# Altium schematic symbol library jlcpcb_2025_04_capacitors_extended_0201.schlib: 1175 symbols (part 5 of 7) (continued)
## GRM0335C1H1R0CA01D
designator C?  Capacitance: 1pF  (hidden comment: *)
Capacitor, Ceramic (MLCC), 1pF, 50V, C0G, SMD 0201; Manufacturer: Murata Electronics; Manufacturer Part Number: GRM0335C1H1R0CA01D; Package Size: 0201; JLCPCB Basic Part: No; JLCPCB Part Number: C85894; Supplier 1: LCSC; Category: Capacitors - MLCC; Supplier Part Number 1: C85894; Voltage Rating: 50V; Temperature Coefficient: C0G; RoHS: Yes; ComponentLink1Description: Datasheet; ComponentLink1URL: https://wmsc.lcsc.com/wmsc/upload/file/pdf/v2/lcsc/2304140030_Murata-Electronics-GRM0335C1H1R0CA01D_C85894.pdf; ComponentLink2Description: JLCPCB Part URL; ComponentLink2URL: https://jlcpcb.com/partdetail/C85894; ComponentLink3Description: LCSC Part URL; ComponentLink3URL: https://lcsc.com/product-detail/Multilayer-Ceramic-Capacitors-MLCC---SMD-SMT_Murata-Electronics-Murata-Electronics-GRM0335C1H1R0CA01D_C85894.html
footprint CAP-0201 (0201 (0603M) Capacitor)
pins: 1, 2

## GRM0335C1H1R0WA01D
designator C?  Capacitance: 1pF  (hidden comment: *)
Capacitor, Ceramic (MLCC), 1pF, 50V, C0G, SMD 0201; Manufacturer: Murata Electronics; Manufacturer Part Number: GRM0335C1H1R0WA01D; Package Size: 0201; JLCPCB Basic Part: No; JLCPCB Part Number: C161411; Supplier 1: LCSC; Category: Capacitors - MLCC; Supplier Part Number 1: C161411; Voltage Rating: 50V; Temperature Coefficient: C0G; RoHS: Yes; ComponentLink1Description: Datasheet; ComponentLink1URL: https://wmsc.lcsc.com/wmsc/upload/file/pdf/v2/lcsc/1811081546_Murata-Electronics-GRM0335C1H1R0WA01D_C161411.pdf; ComponentLink2Description: JLCPCB Part URL; ComponentLink2URL: https://jlcpcb.com/partdetail/C161411; ComponentLink3Description: LCSC Part URL; ComponentLink3URL: https://lcsc.com/product-detail/Multilayer-Ceramic-Capacitors-MLCC---SMD-SMT_Murata-Electronics-Murata-Electronics-GRM0335C1H1R0WA01D_C161411.html
footprint CAP-0201 (0201 (0603M) Capacitor)
pins: 1, 2

## GRM0335C1H1R1BA01D
designator C?  Capacitance: 1.1pF  (hidden comment: *)
Capacitor, Ceramic (MLCC), 1.1pF, 50V, C0G, SMD 0201; Manufacturer: Murata Electronics; Manufacturer Part Number: GRM0335C1H1R1BA01D; Package Size: 0201; JLCPCB Basic Part: No; JLCPCB Part Number: C384969; Supplier 1: LCSC; Category: Capacitors - MLCC; Supplier Part Number 1: C384969; Voltage Rating: 50V; Temperature Coefficient: C0G; RoHS: Yes; ComponentLink1Description: Datasheet; ComponentLink1URL: https://wmsc.lcsc.com/wmsc/upload/file/pdf/v2/lcsc/2304140030_Murata-Electronics-GRM0335C1H1R1BA01D_C384969.pdf; ComponentLink2Description: JLCPCB Part URL; ComponentLink2URL: https://jlcpcb.com/partdetail/C384969; ComponentLink3Description: LCSC Part URL; ComponentLink3URL: https://lcsc.com/product-detail/Multilayer-Ceramic-Capacitors-MLCC---SMD-SMT_Murata-Electronics-Murata-Electronics-GRM0335C1H1R1BA01D_C384969.html
footprint CAP-0201 (0201 (0603M) Capacitor)
pins: 1, 2

## GRM0335C1H1R2BA01D
designator C?  Capacitance: 1.2pF  (hidden comment: *)
Capacitor, Ceramic (MLCC), 1.2pF, 50V, C0G, SMD 0201; Manufacturer: Murata Electronics; Manufacturer Part Number: GRM0335C1H1R2BA01D; Package Size: 0201; JLCPCB Basic Part: No; JLCPCB Part Number: C85895; Supplier 1: LCSC; Category: Capacitors - MLCC; Supplier Part Number 1: C85895; Voltage Rating: 50V; Temperature Coefficient: C0G; RoHS: Yes; ComponentLink1Description: Datasheet; ComponentLink1URL: https://wmsc.lcsc.com/wmsc/upload/file/pdf/v2/lcsc/2304140030_Murata-Electronics-GRM0335C1H1R2BA01D_C85895.pdf; ComponentLink2Description: JLCPCB Part URL; ComponentLink2URL: https://jlcpcb.com/partdetail/C85895; ComponentLink3Description: LCSC Part URL; ComponentLink3URL: https://lcsc.com/product-detail/Multilayer-Ceramic-Capacitors-MLCC---SMD-SMT_Murata-Electronics-Murata-Electronics-GRM0335C1H1R2BA01D_C85895.html
footprint CAP-0201 (0201 (0603M) Capacitor)
pins: 1, 2

## GRM0335C1H1R2CA01D
designator C?  Capacitance: 1.2pF  (hidden comment: *)
Capacitor, Ceramic (MLCC), 1.2pF, 50V, C0G, SMD 0201; Manufacturer: Murata Electronics; Manufacturer Part Number: GRM0335C1H1R2CA01D; Package Size: 0201; JLCPCB Basic Part: No; JLCPCB Part Number: C85896; Supplier 1: LCSC; Category: Capacitors - MLCC; Supplier Part Number 1: C85896; Voltage Rating: 50V; Temperature Coefficient: C0G; RoHS: Yes; ComponentLink1Description: Datasheet; ComponentLink1URL: https://wmsc.lcsc.com/wmsc/upload/file/pdf/v2/lcsc/2304140030_Murata-Electronics-GRM0335C1H1R2CA01D_C85896.pdf; ComponentLink2Description: JLCPCB Part URL; ComponentLink2URL: https://jlcpcb.com/partdetail/C85896; ComponentLink3Description: LCSC Part URL; ComponentLink3URL: https://lcsc.com/product-detail/Multilayer-Ceramic-Capacitors-MLCC---SMD-SMT_Murata-Electronics-Murata-Electronics-GRM0335C1H1R2CA01D_C85896.html
footprint CAP-0201 (0201 (0603M) Capacitor)
pins: 1, 2

## GRM0335C1H1R2WA01D
designator C?  Capacitance: 1.2pF  (hidden comment: *)
Capacitor, Ceramic (MLCC), 1.2pF, 50V, C0G, SMD 0201; Manufacturer: Murata Electronics; Manufacturer Part Number: GRM0335C1H1R2WA01D; Package Size: 0201; JLCPCB Basic Part: No; JLCPCB Part Number: C161412; Supplier 1: LCSC; Category: Capacitors - MLCC; Supplier Part Number 1: C161412; Voltage Rating: 50V; Temperature Coefficient: C0G; RoHS: Yes; ComponentLink1Description: Datasheet; ComponentLink1URL: https://wmsc.lcsc.com/wmsc/upload/file/pdf/v2/lcsc/1811081546_Murata-Electronics-GRM0335C1H1R2WA01D_C161412.pdf; ComponentLink2Description: JLCPCB Part URL; ComponentLink2URL: https://jlcpcb.com/partdetail/C161412; ComponentLink3Description: LCSC Part URL; ComponentLink3URL: https://lcsc.com/product-detail/Multilayer-Ceramic-Capacitors-MLCC---SMD-SMT_Murata-Electronics-Murata-Electronics-GRM0335C1H1R2WA01D_C161412.html
footprint CAP-0201 (0201 (0603M) Capacitor)
pins: 1, 2

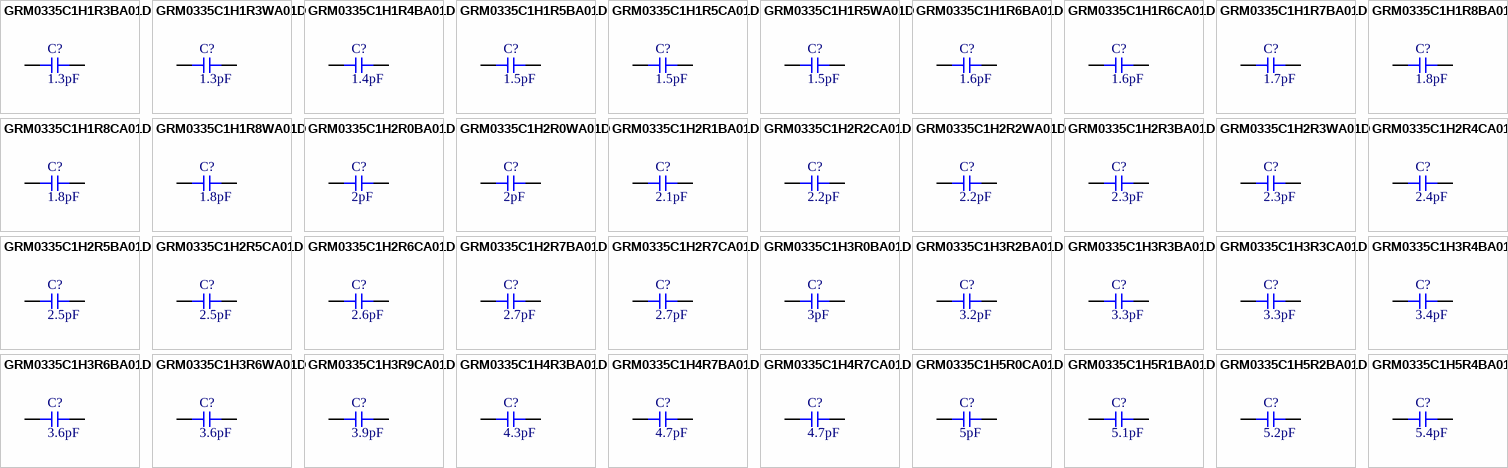
[diagram p22: symbols GRM0335C1H1R3BA01D to GRM0335C1H5R4BA01D]

## GRM0335C1H1R3BA01D
designator C?  Capacitance: 1.3pF  (hidden comment: *)
Capacitor, Ceramic (MLCC), 1.3pF, 50V, C0G, SMD 0201; Manufacturer: Murata Electronics; Manufacturer Part Number: GRM0335C1H1R3BA01D; Package Size: 0201; JLCPCB Basic Part: No; JLCPCB Part Number: C237529; Supplier 1: LCSC; Category: Capacitors - MLCC; Supplier Part Number 1: C237529; Voltage Rating: 50V; Temperature Coefficient: C0G; RoHS: Yes; ComponentLink1Description: Datasheet; ComponentLink1URL: https://wmsc.lcsc.com/wmsc/upload/file/pdf/v2/lcsc/1912111437_Murata-Electronics-GRM0335C1H1R3BA01D_C237529.pdf; ComponentLink2Description: JLCPCB Part URL; ComponentLink2URL: https://jlcpcb.com/partdetail/C237529; ComponentLink3Description: LCSC Part URL; ComponentLink3URL: https://lcsc.com/product-detail/Multilayer-Ceramic-Capacitors-MLCC---SMD-SMT_Murata-Electronics-Murata-Electronics-GRM0335C1H1R3BA01D_C237529.html
footprint CAP-0201 (0201 (0603M) Capacitor)
pins: 1, 2

## GRM0335C1H1R3WA01D
designator C?  Capacitance: 1.3pF  (hidden comment: *)
Capacitor, Ceramic (MLCC), 1.3pF, 50V, C0G, SMD 0201; Manufacturer: Murata Electronics; Manufacturer Part Number: GRM0335C1H1R3WA01D; Package Size: 0201; JLCPCB Basic Part: No; JLCPCB Part Number: C88912; Supplier 1: LCSC; Category: Capacitors - MLCC; Supplier Part Number 1: C88912; Voltage Rating: 50V; Temperature Coefficient: C0G; RoHS: Yes; ComponentLink1Description: Datasheet; ComponentLink1URL: https://wmsc.lcsc.com/wmsc/upload/file/pdf/v2/lcsc/2304140030_Murata-Electronics-GRM0335C1H1R3WA01D_C88912.pdf; ComponentLink2Description: JLCPCB Part URL; ComponentLink2URL: https://jlcpcb.com/partdetail/C88912; ComponentLink3Description: LCSC Part URL; ComponentLink3URL: https://lcsc.com/product-detail/Multilayer-Ceramic-Capacitors-MLCC---SMD-SMT_Murata-Electronics-Murata-Electronics-GRM0335C1H1R3WA01D_C88912.html
footprint CAP-0201 (0201 (0603M) Capacitor)
pins: 1, 2

## GRM0335C1H1R4BA01D
designator C?  Capacitance: 1.4pF  (hidden comment: *)
Capacitor, Ceramic (MLCC), 1.4pF, null, null, SMD 0201; Manufacturer: Murata Electronics; Manufacturer Part Number: GRM0335C1H1R4BA01D; Package Size: 0201; JLCPCB Basic Part: No; JLCPCB Part Number: C913552; Supplier 1: LCSC; Category: Capacitors - MLCC; Supplier Part Number 1: C913552; Voltage Rating: null; Temperature Coefficient: null; RoHS: Yes; ComponentLink1Description: Datasheet; ComponentLink1URL: https://wmsc.lcsc.com/wmsc/upload/file/pdf/v2/lcsc/2201131300_Murata-Electronics-GRM0335C1H1R4BA01D_C913552.pdf; ComponentLink2Description: JLCPCB Part URL; ComponentLink2URL: https://jlcpcb.com/partdetail/C913552; ComponentLink3Description: LCSC Part URL; ComponentLink3URL: https://lcsc.com/product-detail/Multilayer-Ceramic-Capacitors-MLCC---SMD-SMT_Murata-Electronics-Murata-Electronics-GRM0335C1H1R4BA01D_C913552.html
footprint CAP-0201 (0201 (0603M) Capacitor)
pins: 1, 2

## GRM0335C1H1R5BA01D
designator C?  Capacitance: 1.5pF  (hidden comment: *)
Capacitor, Ceramic (MLCC), 1.5pF, 50V, C0G, SMD 0201; Manufacturer: Murata Electronics; Manufacturer Part Number: GRM0335C1H1R5BA01D; Package Size: 0201; JLCPCB Basic Part: No; JLCPCB Part Number: C161414; Supplier 1: LCSC; Category: Capacitors - MLCC; Supplier Part Number 1: C161414; Voltage Rating: 50V; Temperature Coefficient: C0G; RoHS: Yes; ComponentLink1Description: Datasheet; ComponentLink1URL: https://wmsc.lcsc.com/wmsc/upload/file/pdf/v2/lcsc/1811081521_Murata-Electronics-GRM0335C1H1R5BA01D_C161414.pdf; ComponentLink2Description: JLCPCB Part URL; ComponentLink2URL: https://jlcpcb.com/partdetail/C161414; ComponentLink3Description: LCSC Part URL; ComponentLink3URL: https://lcsc.com/product-detail/Multilayer-Ceramic-Capacitors-MLCC---SMD-SMT_Murata-Electronics-Murata-Electronics-GRM0335C1H1R5BA01D_C161414.html
footprint CAP-0201 (0201 (0603M) Capacitor)
pins: 1, 2

## GRM0335C1H1R5CA01D
designator C?  Capacitance: 1.5pF  (hidden comment: *)
Capacitor, Ceramic (MLCC), 1.5pF, 50V, C0G, SMD 0201; Manufacturer: Murata Electronics; Manufacturer Part Number: GRM0335C1H1R5CA01D; Package Size: 0201; JLCPCB Basic Part: No; JLCPCB Part Number: C85897; Supplier 1: LCSC; Category: Capacitors - MLCC; Supplier Part Number 1: C85897; Voltage Rating: 50V; Temperature Coefficient: C0G; RoHS: Yes; ComponentLink1Description: Datasheet; ComponentLink1URL: https://wmsc.lcsc.com/wmsc/upload/file/pdf/v2/lcsc/2304140030_Murata-Electronics-GRM0335C1H1R5CA01D_C85897.pdf; ComponentLink2Description: JLCPCB Part URL; ComponentLink2URL: https://jlcpcb.com/partdetail/C85897; ComponentLink3Description: LCSC Part URL; ComponentLink3URL: https://lcsc.com/product-detail/Multilayer-Ceramic-Capacitors-MLCC---SMD-SMT_Murata-Electronics-Murata-Electronics-GRM0335C1H1R5CA01D_C85897.html
footprint CAP-0201 (0201 (0603M) Capacitor)
pins: 1, 2

## GRM0335C1H1R5WA01D
designator C?  Capacitance: 1.5pF  (hidden comment: *)
Capacitor, Ceramic (MLCC), 1.5pF, 50V, C0G, SMD 0201; Manufacturer: Murata Electronics; Manufacturer Part Number: GRM0335C1H1R5WA01D; Package Size: 0201; JLCPCB Basic Part: No; JLCPCB Part Number: C88913; Supplier 1: LCSC; Category: Capacitors - MLCC; Supplier Part Number 1: C88913; Voltage Rating: 50V; Temperature Coefficient: C0G; RoHS: Yes; ComponentLink1Description: Datasheet; ComponentLink1URL: https://wmsc.lcsc.com/wmsc/upload/file/pdf/v2/lcsc/2304140030_Murata-Electronics-GRM0335C1H1R5WA01D_C88913.pdf; ComponentLink2Description: JLCPCB Part URL; ComponentLink2URL: https://jlcpcb.com/partdetail/C88913; ComponentLink3Description: LCSC Part URL; ComponentLink3URL: https://lcsc.com/product-detail/Multilayer-Ceramic-Capacitors-MLCC---SMD-SMT_Murata-Electronics-Murata-Electronics-GRM0335C1H1R5WA01D_C88913.html
footprint CAP-0201 (0201 (0603M) Capacitor)
pins: 1, 2

## GRM0335C1H1R6BA01D
designator C?  Capacitance: 1.6pF  (hidden comment: *)
Capacitor, Ceramic (MLCC), 1.6pF, 50V, C0G, SMD 0201; Manufacturer: Murata Electronics; Manufacturer Part Number: GRM0335C1H1R6BA01D; Package Size: 0201; JLCPCB Basic Part: No; JLCPCB Part Number: C440159; Supplier 1: LCSC; Category: Capacitors - MLCC; Supplier Part Number 1: C440159; Voltage Rating: 50V; Temperature Coefficient: C0G; RoHS: Yes; ComponentLink1Description: Datasheet; ComponentLink1URL: https://wmsc.lcsc.com/wmsc/upload/file/pdf/v2/lcsc/2304140030_Murata-Electronics-GRM0335C1H1R6BA01D_C440159.pdf; ComponentLink2Description: JLCPCB Part URL; ComponentLink2URL: https://jlcpcb.com/partdetail/C440159; ComponentLink3Description: LCSC Part URL; ComponentLink3URL: https://lcsc.com/product-detail/Multilayer-Ceramic-Capacitors-MLCC---SMD-SMT_Murata-Electronics-Murata-Electronics-GRM0335C1H1R6BA01D_C440159.html
footprint CAP-0201 (0201 (0603M) Capacitor)
pins: 1, 2

## GRM0335C1H1R6CA01D
designator C?  Capacitance: 1.6pF  (hidden comment: *)
Capacitor, Ceramic (MLCC), 1.6pF, null, null, SMD 0201; Manufacturer: Murata Electronics; Manufacturer Part Number: GRM0335C1H1R6CA01D; Package Size: 0201; JLCPCB Basic Part: No; JLCPCB Part Number: C701313; Supplier 1: LCSC; Category: Capacitors - MLCC; Supplier Part Number 1: C701313; Voltage Rating: null; Temperature Coefficient: null; RoHS: Yes; ComponentLink1Description: Datasheet; ComponentLink1URL: https://wmsc.lcsc.com/wmsc/upload/file/pdf/v2/lcsc/2304140030_Murata-Electronics-GRM0335C1H1R6CA01D_C701313.pdf; ComponentLink2Description: JLCPCB Part URL; ComponentLink2URL: https://jlcpcb.com/partdetail/C701313; ComponentLink3Description: LCSC Part URL; ComponentLink3URL: https://lcsc.com/product-detail/Multilayer-Ceramic-Capacitors-MLCC---SMD-SMT_Murata-Electronics-Murata-Electronics-GRM0335C1H1R6CA01D_C701313.html
footprint CAP-0201 (0201 (0603M) Capacitor)
pins: 1, 2

## GRM0335C1H1R7BA01D
designator C?  Capacitance: 1.7pF  (hidden comment: *)
Capacitor, Ceramic (MLCC), 1.7pF, 50V, null, SMD 0201; Manufacturer: Murata Electronics; Manufacturer Part Number: GRM0335C1H1R7BA01D; Package Size: 0201; JLCPCB Basic Part: No; JLCPCB Part Number: C710809; Supplier 1: LCSC; Category: Capacitors - MLCC; Supplier Part Number 1: C710809; Voltage Rating: 50V; Temperature Coefficient: null; RoHS: Yes; ComponentLink1Description: Datasheet; ComponentLink1URL: https://wmsc.lcsc.com/wmsc/upload/file/pdf/v2/lcsc/2201131100_Murata-Electronics-GRM0335C1H1R7BA01D_C710809.pdf; ComponentLink2Description: JLCPCB Part URL; ComponentLink2URL: https://jlcpcb.com/partdetail/C710809; ComponentLink3Description: LCSC Part URL; ComponentLink3URL: https://lcsc.com/product-detail/Multilayer-Ceramic-Capacitors-MLCC---SMD-SMT_Murata-Electronics-Murata-Electronics-GRM0335C1H1R7BA01D_C710809.html
footprint CAP-0201 (0201 (0603M) Capacitor)
pins: 1, 2

## GRM0335C1H1R8BA01D
designator C?  Capacitance: 1.8pF  (hidden comment: *)
Capacitor, Ceramic (MLCC), 1.8pF, 50V, C0G, SMD 0201; Manufacturer: Murata Electronics; Manufacturer Part Number: GRM0335C1H1R8BA01D; Package Size: 0201; JLCPCB Basic Part: No; JLCPCB Part Number: C161415; Supplier 1: LCSC; Category: Capacitors - MLCC; Supplier Part Number 1: C161415; Voltage Rating: 50V; Temperature Coefficient: C0G; RoHS: Yes; ComponentLink1Description: Datasheet; ComponentLink1URL: https://wmsc.lcsc.com/wmsc/upload/file/pdf/v2/lcsc/2304140030_Murata-Electronics-GRM0335C1H1R8BA01D_C161415.pdf; ComponentLink2Description: JLCPCB Part URL; ComponentLink2URL: https://jlcpcb.com/partdetail/C161415; ComponentLink3Description: LCSC Part URL; ComponentLink3URL: https://lcsc.com/product-detail/Multilayer-Ceramic-Capacitors-MLCC---SMD-SMT_Murata-Electronics-Murata-Electronics-GRM0335C1H1R8BA01D_C161415.html
footprint CAP-0201 (0201 (0603M) Capacitor)
pins: 1, 2

## GRM0335C1H1R8CA01D
designator C?  Capacitance: 1.8pF  (hidden comment: *)
Capacitor, Ceramic (MLCC), 1.8pF, 50V, C0G, SMD 0201; Manufacturer: Murata Electronics; Manufacturer Part Number: GRM0335C1H1R8CA01D; Package Size: 0201; JLCPCB Basic Part: No; JLCPCB Part Number: C85898; Supplier 1: LCSC; Category: Capacitors - MLCC; Supplier Part Number 1: C85898; Voltage Rating: 50V; Temperature Coefficient: C0G; RoHS: Yes; ComponentLink1Description: Datasheet; ComponentLink1URL: https://wmsc.lcsc.com/wmsc/upload/file/pdf/v2/lcsc/2304140030_Murata-Electronics-GRM0335C1H1R8CA01D_C85898.pdf; ComponentLink2Description: JLCPCB Part URL; ComponentLink2URL: https://jlcpcb.com/partdetail/C85898; ComponentLink3Description: LCSC Part URL; ComponentLink3URL: https://lcsc.com/product-detail/Multilayer-Ceramic-Capacitors-MLCC---SMD-SMT_Murata-Electronics-Murata-Electronics-GRM0335C1H1R8CA01D_C85898.html
footprint CAP-0201 (0201 (0603M) Capacitor)
pins: 1, 2

## GRM0335C1H1R8WA01D
designator C?  Capacitance: 1.8pF  (hidden comment: *)
Capacitor, Ceramic (MLCC), 1.8pF, 50V, C0G, SMD 0201; Manufacturer: Murata Electronics; Manufacturer Part Number: GRM0335C1H1R8WA01D; Package Size: 0201; JLCPCB Basic Part: No; JLCPCB Part Number: C161416; Supplier 1: LCSC; Category: Capacitors - MLCC; Supplier Part Number 1: C161416; Voltage Rating: 50V; Temperature Coefficient: C0G; RoHS: Yes; ComponentLink1Description: Datasheet; ComponentLink1URL: https://wmsc.lcsc.com/wmsc/upload/file/pdf/v2/lcsc/2110271730_Murata-Electronics-GRM0335C1H1R8WA01D_C161416.pdf; ComponentLink2Description: JLCPCB Part URL; ComponentLink2URL: https://jlcpcb.com/partdetail/C161416; ComponentLink3Description: LCSC Part URL; ComponentLink3URL: https://lcsc.com/product-detail/Multilayer-Ceramic-Capacitors-MLCC---SMD-SMT_Murata-Electronics-Murata-Electronics-GRM0335C1H1R8WA01D_C161416.html
footprint CAP-0201 (0201 (0603M) Capacitor)
pins: 1, 2

## GRM0335C1H2R0BA01D
designator C?  Capacitance: 2pF  (hidden comment: *)
Capacitor, Ceramic (MLCC), 2pF, 50V, C0G, SMD 0201; Manufacturer: Murata Electronics; Manufacturer Part Number: GRM0335C1H2R0BA01D; Package Size: 0201; JLCPCB Basic Part: No; JLCPCB Part Number: C161419; Supplier 1: LCSC; Category: Capacitors - MLCC; Supplier Part Number 1: C161419; Voltage Rating: 50V; Temperature Coefficient: C0G; RoHS: Yes; ComponentLink1Description: Datasheet; ComponentLink1URL: https://wmsc.lcsc.com/wmsc/upload/file/pdf/v2/lcsc/1811081551_Murata-Electronics-GRM0335C1H2R0BA01D_C161419.pdf; ComponentLink2Description: JLCPCB Part URL; ComponentLink2URL: https://jlcpcb.com/partdetail/C161419; ComponentLink3Description: LCSC Part URL; ComponentLink3URL: https://lcsc.com/product-detail/Multilayer-Ceramic-Capacitors-MLCC---SMD-SMT_Murata-Electronics-Murata-Electronics-GRM0335C1H2R0BA01D_C161419.html
footprint CAP-0201 (0201 (0603M) Capacitor)
pins: 1, 2

## GRM0335C1H2R0WA01D
designator C?  Capacitance: 2pF  (hidden comment: *)
Capacitor, Ceramic (MLCC), 2pF, 50V, C0G, SMD 0201; Manufacturer: Murata Electronics; Manufacturer Part Number: GRM0335C1H2R0WA01D; Package Size: 0201; JLCPCB Basic Part: No; JLCPCB Part Number: C1864526; Supplier 1: LCSC; Category: Capacitors - MLCC; Supplier Part Number 1: C1864526; Voltage Rating: 50V; Temperature Coefficient: C0G; RoHS: Yes; ComponentLink1Description: Datasheet; ComponentLink1URL: https://wmsc.lcsc.com/wmsc/upload/file/pdf/v2/lcsc/2201271830_Murata-Electronics-GRM0335C1H2R0WA01D_C1864526.pdf; ComponentLink2Description: JLCPCB Part URL; ComponentLink2URL: https://jlcpcb.com/partdetail/C1864526; ComponentLink3Description: LCSC Part URL; ComponentLink3URL: https://lcsc.com/product-detail/Multilayer-Ceramic-Capacitors-MLCC---SMD-SMT_Murata-Electronics-Murata-Electronics-GRM0335C1H2R0WA01D_C1864526.html
footprint CAP-0201 (0201 (0603M) Capacitor)
pins: 1, 2

## GRM0335C1H2R1BA01D
designator C?  Capacitance: 2.1pF  (hidden comment: *)
Capacitor, Ceramic (MLCC), 2.1pF, 50V, null, SMD 0201; Manufacturer: Murata Electronics; Manufacturer Part Number: GRM0335C1H2R1BA01D; Package Size: 0201; JLCPCB Basic Part: No; JLCPCB Part Number: C3846100; Supplier 1: LCSC; Category: Capacitors - MLCC; Supplier Part Number 1: C3846100; Voltage Rating: 50V; Temperature Coefficient: null; RoHS: Yes; ComponentLink1Description: Datasheet; ComponentLink1URL: https://wmsc.lcsc.com/wmsc/upload/file/pdf/v2/lcsc/2308111459_Murata-Electronics-GRM0335C1H2R1BA01D_C3846100.pdf; ComponentLink2Description: JLCPCB Part URL; ComponentLink2URL: https://jlcpcb.com/partdetail/C3846100; ComponentLink3Description: LCSC Part URL; ComponentLink3URL: https://lcsc.com/product-detail/Multilayer-Ceramic-Capacitors-MLCC---SMD-SMT_Murata-Electronics-Murata-Electronics-GRM0335C1H2R1BA01D_C3846100.html
footprint CAP-0201 (0201 (0603M) Capacitor)
pins: 1, 2

## GRM0335C1H2R2CA01D
designator C?  Capacitance: 2.2pF  (hidden comment: *)
Capacitor, Ceramic (MLCC), 2.2pF, 50V, C0G, SMD 0201; Manufacturer: Murata Electronics; Manufacturer Part Number: GRM0335C1H2R2CA01D; Package Size: 0201; JLCPCB Basic Part: No; JLCPCB Part Number: C85901; Supplier 1: LCSC; Category: Capacitors - MLCC; Supplier Part Number 1: C85901; Voltage Rating: 50V; Temperature Coefficient: C0G; RoHS: Yes; ComponentLink1Description: Datasheet; ComponentLink1URL: https://wmsc.lcsc.com/wmsc/upload/file/pdf/v2/lcsc/2304140030_Murata-Electronics-GRM0335C1H2R2CA01D_C85901.pdf; ComponentLink2Description: JLCPCB Part URL; ComponentLink2URL: https://jlcpcb.com/partdetail/C85901; ComponentLink3Description: LCSC Part URL; ComponentLink3URL: https://lcsc.com/product-detail/Multilayer-Ceramic-Capacitors-MLCC---SMD-SMT_Murata-Electronics-Murata-Electronics-GRM0335C1H2R2CA01D_C85901.html
footprint CAP-0201 (0201 (0603M) Capacitor)
pins: 1, 2

## GRM0335C1H2R2WA01D
designator C?  Capacitance: 2.2pF  (hidden comment: *)
Capacitor, Ceramic (MLCC), 2.2pF, 50V, C0G, SMD 0201; Manufacturer: Murata Electronics; Manufacturer Part Number: GRM0335C1H2R2WA01D; Package Size: 0201; JLCPCB Basic Part: No; JLCPCB Part Number: C384977; Supplier 1: LCSC; Category: Capacitors - MLCC; Supplier Part Number 1: C384977; Voltage Rating: 50V; Temperature Coefficient: C0G; RoHS: Yes; ComponentLink1Description: Datasheet; ComponentLink1URL: https://wmsc.lcsc.com/wmsc/upload/file/pdf/v2/lcsc/2304140030_Murata-Electronics-GRM0335C1H2R2WA01D_C384977.pdf; ComponentLink2Description: JLCPCB Part URL; ComponentLink2URL: https://jlcpcb.com/partdetail/C384977; ComponentLink3Description: LCSC Part URL; ComponentLink3URL: https://lcsc.com/product-detail/Multilayer-Ceramic-Capacitors-MLCC---SMD-SMT_Murata-Electronics-Murata-Electronics-GRM0335C1H2R2WA01D_C384977.html
footprint CAP-0201 (0201 (0603M) Capacitor)
pins: 1, 2

## GRM0335C1H2R3BA01D
designator C?  Capacitance: 2.3pF  (hidden comment: *)
Capacitor, Ceramic (MLCC), 2.3pF, 50V, null, SMD 0201; Manufacturer: Murata Electronics; Manufacturer Part Number: GRM0335C1H2R3BA01D; Package Size: 0201; JLCPCB Basic Part: No; JLCPCB Part Number: C2176254; Supplier 1: LCSC; Category: Capacitors - MLCC; Supplier Part Number 1: C2176254; Voltage Rating: 50V; Temperature Coefficient: null; RoHS: Yes; ComponentLink1Description: Datasheet; ComponentLink1URL: https://wmsc.lcsc.com/wmsc/upload/file/pdf/v2/lcsc/2202081300_Murata-Electronics-GRM0335C1H2R3BA01D_C2176254.pdf; ComponentLink2Description: JLCPCB Part URL; ComponentLink2URL: https://jlcpcb.com/partdetail/C2176254; ComponentLink3Description: LCSC Part URL; ComponentLink3URL: https://lcsc.com/product-detail/Multilayer-Ceramic-Capacitors-MLCC---SMD-SMT_Murata-Electronics-Murata-Electronics-GRM0335C1H2R3BA01D_C2176254.html
footprint CAP-0201 (0201 (0603M) Capacitor)
pins: 1, 2

## GRM0335C1H2R3WA01D
designator C?  Capacitance: 2.3pF  (hidden comment: *)
Capacitor, Ceramic (MLCC), 2.3pF, 50V, C0G, SMD 0201; Manufacturer: Murata Electronics; Manufacturer Part Number: GRM0335C1H2R3WA01D; Package Size: 0201; JLCPCB Basic Part: No; JLCPCB Part Number: C710810; Supplier 1: LCSC; Category: Capacitors - MLCC; Supplier Part Number 1: C710810; Voltage Rating: 50V; Temperature Coefficient: C0G; RoHS: Yes; ComponentLink1Description: Datasheet; ComponentLink2Description: JLCPCB Part URL; ComponentLink2URL: https://jlcpcb.com/partdetail/C710810; ComponentLink3Description: LCSC Part URL; ComponentLink3URL: https://lcsc.com/product-detail/Multilayer-Ceramic-Capacitors-MLCC---SMD-SMT_Murata-Electronics-Murata-Electronics-GRM0335C1H2R3WA01D_C710810.html
footprint CAP-0201 (0201 (0603M) Capacitor)
pins: 1, 2

## GRM0335C1H2R4CA01D
designator C?  Capacitance: 2.4pF  (hidden comment: *)
Capacitor, Ceramic (MLCC), 2.4pF, 50V, C0G, SMD 0201; Manufacturer: Murata Electronics; Manufacturer Part Number: GRM0335C1H2R4CA01D; Package Size: 0201; JLCPCB Basic Part: No; JLCPCB Part Number: C161421; Supplier 1: LCSC; Category: Capacitors - MLCC; Supplier Part Number 1: C161421; Voltage Rating: 50V; Temperature Coefficient: C0G; RoHS: Yes; ComponentLink1Description: Datasheet; ComponentLink1URL: https://wmsc.lcsc.com/wmsc/upload/file/pdf/v2/lcsc/1811081530_Murata-Electronics-GRM0335C1H2R4CA01D_C161421.pdf; ComponentLink2Description: JLCPCB Part URL; ComponentLink2URL: https://jlcpcb.com/partdetail/C161421; ComponentLink3Description: LCSC Part URL; ComponentLink3URL: https://lcsc.com/product-detail/Multilayer-Ceramic-Capacitors-MLCC---SMD-SMT_Murata-Electronics-Murata-Electronics-GRM0335C1H2R4CA01D_C161421.html
footprint CAP-0201 (0201 (0603M) Capacitor)
pins: 1, 2

## GRM0335C1H2R5BA01D
designator C?  Capacitance: 2.5pF  (hidden comment: *)
Capacitor, Ceramic (MLCC), 2.5pF, 50V, C0G, SMD 0201; Manufacturer: Murata Electronics; Manufacturer Part Number: GRM0335C1H2R5BA01D; Package Size: 0201; JLCPCB Basic Part: No; JLCPCB Part Number: C384978; Supplier 1: LCSC; Category: Capacitors - MLCC; Supplier Part Number 1: C384978; Voltage Rating: 50V; Temperature Coefficient: C0G; RoHS: Yes; ComponentLink1Description: Datasheet; ComponentLink1URL: https://wmsc.lcsc.com/wmsc/upload/file/pdf/v2/lcsc/2304140030_Murata-Electronics-GRM0335C1H2R5BA01D_C384978.pdf; ComponentLink2Description: JLCPCB Part URL; ComponentLink2URL: https://jlcpcb.com/partdetail/C384978; ComponentLink3Description: LCSC Part URL; ComponentLink3URL: https://lcsc.com/product-detail/Multilayer-Ceramic-Capacitors-MLCC---SMD-SMT_Murata-Electronics-Murata-Electronics-GRM0335C1H2R5BA01D_C384978.html
footprint CAP-0201 (0201 (0603M) Capacitor)
pins: 1, 2

## GRM0335C1H2R5CA01D
designator C?  Capacitance: 2.5pF  (hidden comment: *)
Capacitor, Ceramic (MLCC), 2.5pF, 50V, C0G, SMD 0201; Manufacturer: Murata Electronics; Manufacturer Part Number: GRM0335C1H2R5CA01D; Package Size: 0201; JLCPCB Basic Part: No; JLCPCB Part Number: C161422; Supplier 1: LCSC; Category: Capacitors - MLCC; Supplier Part Number 1: C161422; Voltage Rating: 50V; Temperature Coefficient: C0G; RoHS: Yes; ComponentLink1Description: Datasheet; ComponentLink1URL: https://wmsc.lcsc.com/wmsc/upload/file/pdf/v2/lcsc/1811081551_Murata-Electronics-GRM0335C1H2R5CA01D_C161422.pdf; ComponentLink2Description: JLCPCB Part URL; ComponentLink2URL: https://jlcpcb.com/partdetail/C161422; ComponentLink3Description: LCSC Part URL; ComponentLink3URL: https://lcsc.com/product-detail/Multilayer-Ceramic-Capacitors-MLCC---SMD-SMT_Murata-Electronics-Murata-Electronics-GRM0335C1H2R5CA01D_C161422.html
footprint CAP-0201 (0201 (0603M) Capacitor)
pins: 1, 2

## GRM0335C1H2R6CA01D
designator C?  Capacitance: 2.6pF  (hidden comment: *)
Capacitor, Ceramic (MLCC), 2.6pF, 50V, C0G, SMD 0201; Manufacturer: Murata Electronics; Manufacturer Part Number: GRM0335C1H2R6CA01D; Package Size: 0201; JLCPCB Basic Part: No; JLCPCB Part Number: C913591; Supplier 1: LCSC; Category: Capacitors - MLCC; Supplier Part Number 1: C913591; Voltage Rating: 50V; Temperature Coefficient: C0G; RoHS: Yes; ComponentLink1Description: Datasheet; ComponentLink1URL: https://wmsc.lcsc.com/wmsc/upload/file/pdf/v2/lcsc/2201131300_Murata-Electronics-GRM0335C1H2R6CA01D_C913591.pdf; ComponentLink2Description: JLCPCB Part URL; ComponentLink2URL: https://jlcpcb.com/partdetail/C913591; ComponentLink3Description: LCSC Part URL; ComponentLink3URL: https://lcsc.com/product-detail/Multilayer-Ceramic-Capacitors-MLCC---SMD-SMT_Murata-Electronics-Murata-Electronics-GRM0335C1H2R6CA01D_C913591.html
footprint CAP-0201 (0201 (0603M) Capacitor)
pins: 1, 2

## GRM0335C1H2R7BA01D
designator C?  Capacitance: 2.7pF  (hidden comment: *)
Capacitor, Ceramic (MLCC), 2.7pF, 50V, C0G, SMD 0201; Manufacturer: Murata Electronics; Manufacturer Part Number: GRM0335C1H2R7BA01D; Package Size: 0201; JLCPCB Basic Part: No; JLCPCB Part Number: C85902; Supplier 1: LCSC; Category: Capacitors - MLCC; Supplier Part Number 1: C85902; Voltage Rating: 50V; Temperature Coefficient: C0G; RoHS: Yes; ComponentLink1Description: Datasheet; ComponentLink1URL: https://wmsc.lcsc.com/wmsc/upload/file/pdf/v2/lcsc/2304140030_Murata-Electronics-GRM0335C1H2R7BA01D_C85902.pdf; ComponentLink2Description: JLCPCB Part URL; ComponentLink2URL: https://jlcpcb.com/partdetail/C85902; ComponentLink3Description: LCSC Part URL; ComponentLink3URL: https://lcsc.com/product-detail/Multilayer-Ceramic-Capacitors-MLCC---SMD-SMT_Murata-Electronics-Murata-Electronics-GRM0335C1H2R7BA01D_C85902.html
footprint CAP-0201 (0201 (0603M) Capacitor)
pins: 1, 2

## GRM0335C1H2R7CA01D
designator C?  Capacitance: 2.7pF  (hidden comment: *)
Capacitor, Ceramic (MLCC), 2.7pF, 50V, C0G, SMD 0201; Manufacturer: Murata Electronics; Manufacturer Part Number: GRM0335C1H2R7CA01D; Package Size: 0201; JLCPCB Basic Part: No; JLCPCB Part Number: C85903; Supplier 1: LCSC; Category: Capacitors - MLCC; Supplier Part Number 1: C85903; Voltage Rating: 50V; Temperature Coefficient: C0G; RoHS: Yes; ComponentLink1Description: Datasheet; ComponentLink1URL: https://wmsc.lcsc.com/wmsc/upload/file/pdf/v2/lcsc/2304140030_Murata-Electronics-GRM0335C1H2R7CA01D_C85903.pdf; ComponentLink2Description: JLCPCB Part URL; ComponentLink2URL: https://jlcpcb.com/partdetail/C85903; ComponentLink3Description: LCSC Part URL; ComponentLink3URL: https://lcsc.com/product-detail/Multilayer-Ceramic-Capacitors-MLCC---SMD-SMT_Murata-Electronics-Murata-Electronics-GRM0335C1H2R7CA01D_C85903.html
footprint CAP-0201 (0201 (0603M) Capacitor)
pins: 1, 2

## GRM0335C1H3R0BA01D
designator C?  Capacitance: 3pF  (hidden comment: *)
Capacitor, Ceramic (MLCC), 3pF, 50V, C0G, SMD 0201; Manufacturer: Murata Electronics; Manufacturer Part Number: GRM0335C1H3R0BA01D; Package Size: 0201; JLCPCB Basic Part: No; JLCPCB Part Number: C237430; Supplier 1: LCSC; Category: Capacitors - MLCC; Supplier Part Number 1: C237430; Voltage Rating: 50V; Temperature Coefficient: C0G; RoHS: Yes; ComponentLink1Description: Datasheet; ComponentLink1URL: https://wmsc.lcsc.com/wmsc/upload/file/pdf/v2/lcsc/2304140030_Murata-Electronics-GRM0335C1H3R0BA01D_C237430.pdf; ComponentLink2Description: JLCPCB Part URL; ComponentLink2URL: https://jlcpcb.com/partdetail/C237430; ComponentLink3Description: LCSC Part URL; ComponentLink3URL: https://lcsc.com/product-detail/Multilayer-Ceramic-Capacitors-MLCC---SMD-SMT_Murata-Electronics-Murata-Electronics-GRM0335C1H3R0BA01D_C237430.html
footprint CAP-0201 (0201 (0603M) Capacitor)
pins: 1, 2

## GRM0335C1H3R2BA01D
designator C?  Capacitance: 3.2pF  (hidden comment: *)
Capacitor, Ceramic (MLCC), 3.2pF, 50V, null, SMD 0201; Manufacturer: Murata Electronics; Manufacturer Part Number: GRM0335C1H3R2BA01D; Package Size: 0201; JLCPCB Basic Part: No; JLCPCB Part Number: C2183960; Supplier 1: LCSC; Category: Capacitors - MLCC; Supplier Part Number 1: C2183960; Voltage Rating: 50V; Temperature Coefficient: null; RoHS: Yes; ComponentLink1Description: Datasheet; ComponentLink1URL: https://wmsc.lcsc.com/wmsc/upload/file/pdf/v2/lcsc/2202041400_Murata-Electronics-GRM0335C1H3R2BA01D_C2183960.pdf; ComponentLink2Description: JLCPCB Part URL; ComponentLink2URL: https://jlcpcb.com/partdetail/C2183960; ComponentLink3Description: LCSC Part URL; ComponentLink3URL: https://lcsc.com/product-detail/Multilayer-Ceramic-Capacitors-MLCC---SMD-SMT_Murata-Electronics-Murata-Electronics-GRM0335C1H3R2BA01D_C2183960.html
footprint CAP-0201 (0201 (0603M) Capacitor)
pins: 1, 2

## GRM0335C1H3R3BA01D
designator C?  Capacitance: 3.3pF  (hidden comment: *)
Capacitor, Ceramic (MLCC), 3.3pF, 50V, C0G, SMD 0201; Manufacturer: Murata Electronics; Manufacturer Part Number: GRM0335C1H3R3BA01D; Package Size: 0201; JLCPCB Basic Part: No; JLCPCB Part Number: C161425; Supplier 1: LCSC; Category: Capacitors - MLCC; Supplier Part Number 1: C161425; Voltage Rating: 50V; Temperature Coefficient: C0G; RoHS: Yes; ComponentLink1Description: Datasheet; ComponentLink1URL: https://wmsc.lcsc.com/wmsc/upload/file/pdf/v2/lcsc/2304140030_Murata-Electronics-GRM0335C1H3R3BA01D_C161425.pdf; ComponentLink2Description: JLCPCB Part URL; ComponentLink2URL: https://jlcpcb.com/partdetail/C161425; ComponentLink3Description: LCSC Part URL; ComponentLink3URL: https://lcsc.com/product-detail/Multilayer-Ceramic-Capacitors-MLCC---SMD-SMT_Murata-Electronics-Murata-Electronics-GRM0335C1H3R3BA01D_C161425.html
footprint CAP-0201 (0201 (0603M) Capacitor)
pins: 1, 2

## GRM0335C1H3R3CA01D
designator C?  Capacitance: 3.3pF  (hidden comment: *)
Capacitor, Ceramic (MLCC), 3.3pF, 50V, C0G, SMD 0201; Manufacturer: Murata Electronics; Manufacturer Part Number: GRM0335C1H3R3CA01D; Package Size: 0201; JLCPCB Basic Part: No; JLCPCB Part Number: C85906; Supplier 1: LCSC; Category: Capacitors - MLCC; Supplier Part Number 1: C85906; Voltage Rating: 50V; Temperature Coefficient: C0G; RoHS: Yes; ComponentLink1Description: Datasheet; ComponentLink1URL: https://wmsc.lcsc.com/wmsc/upload/file/pdf/v2/lcsc/2304140030_Murata-Electronics-GRM0335C1H3R3CA01D_C85906.pdf; ComponentLink2Description: JLCPCB Part URL; ComponentLink2URL: https://jlcpcb.com/partdetail/C85906; ComponentLink3Description: LCSC Part URL; ComponentLink3URL: https://lcsc.com/product-detail/Multilayer-Ceramic-Capacitors-MLCC---SMD-SMT_Murata-Electronics-Murata-Electronics-GRM0335C1H3R3CA01D_C85906.html
footprint CAP-0201 (0201 (0603M) Capacitor)
pins: 1, 2

## GRM0335C1H3R4BA01D
designator C?  Capacitance: 3.4pF  (hidden comment: *)
Capacitor, Ceramic (MLCC), 3.4pF, 50V, null, SMD 0201; Manufacturer: Murata Electronics; Manufacturer Part Number: GRM0335C1H3R4BA01D; Package Size: 0201; JLCPCB Basic Part: No; JLCPCB Part Number: C2183976; Supplier 1: LCSC; Category: Capacitors - MLCC; Supplier Part Number 1: C2183976; Voltage Rating: 50V; Temperature Coefficient: null; RoHS: Yes; ComponentLink1Description: Datasheet; ComponentLink1URL: https://wmsc.lcsc.com/wmsc/upload/file/pdf/v2/lcsc/2202041400_Murata-Electronics-GRM0335C1H3R4BA01D_C2183976.pdf; ComponentLink2Description: JLCPCB Part URL; ComponentLink2URL: https://jlcpcb.com/partdetail/C2183976; ComponentLink3Description: LCSC Part URL; ComponentLink3URL: https://lcsc.com/product-detail/Multilayer-Ceramic-Capacitors-MLCC---SMD-SMT_Murata-Electronics-Murata-Electronics-GRM0335C1H3R4BA01D_C2183976.html
footprint CAP-0201 (0201 (0603M) Capacitor)
pins: 1, 2

## GRM0335C1H3R6BA01D
designator C?  Capacitance: 3.6pF  (hidden comment: *)
Capacitor, Ceramic (MLCC), 3.6pF, 50V, C0G, SMD 0201; Manufacturer: Murata Electronics; Manufacturer Part Number: GRM0335C1H3R6BA01D; Package Size: 0201; JLCPCB Basic Part: No; JLCPCB Part Number: C161426; Supplier 1: LCSC; Category: Capacitors - MLCC; Supplier Part Number 1: C161426; Voltage Rating: 50V; Temperature Coefficient: C0G; RoHS: Yes; ComponentLink1Description: Datasheet; ComponentLink1URL: https://wmsc.lcsc.com/wmsc/upload/file/pdf/v2/lcsc/1811081551_Murata-Electronics-GRM0335C1H3R6BA01D_C161426.pdf; ComponentLink2Description: JLCPCB Part URL; ComponentLink2URL: https://jlcpcb.com/partdetail/C161426; ComponentLink3Description: LCSC Part URL; ComponentLink3URL: https://lcsc.com/product-detail/Multilayer-Ceramic-Capacitors-MLCC---SMD-SMT_Murata-Electronics-Murata-Electronics-GRM0335C1H3R6BA01D_C161426.html
footprint CAP-0201 (0201 (0603M) Capacitor)
pins: 1, 2

## GRM0335C1H3R6WA01D
designator C?  Capacitance: 3.6pF  (hidden comment: *)
Capacitor, Ceramic (MLCC), 3.6pF, 50V, C0G, SMD 0201; Manufacturer: Murata Electronics; Manufacturer Part Number: GRM0335C1H3R6WA01D; Package Size: 0201; JLCPCB Basic Part: No; JLCPCB Part Number: C384990; Supplier 1: LCSC; Category: Capacitors - MLCC; Supplier Part Number 1: C384990; Voltage Rating: 50V; Temperature Coefficient: C0G; RoHS: Yes; ComponentLink1Description: Datasheet; ComponentLink1URL: https://wmsc.lcsc.com/wmsc/upload/file/pdf/v2/lcsc/2304140030_Murata-Electronics-GRM0335C1H3R6WA01D_C384990.pdf; ComponentLink2Description: JLCPCB Part URL; ComponentLink2URL: https://jlcpcb.com/partdetail/C384990; ComponentLink3Description: LCSC Part URL; ComponentLink3URL: https://lcsc.com/product-detail/Multilayer-Ceramic-Capacitors-MLCC---SMD-SMT_Murata-Electronics-Murata-Electronics-GRM0335C1H3R6WA01D_C384990.html
footprint CAP-0201 (0201 (0603M) Capacitor)
pins: 1, 2

## GRM0335C1H3R9CA01D
designator C?  Capacitance: 3.9pF  (hidden comment: *)
Capacitor, Ceramic (MLCC), 3.9pF, 50V, C0G, SMD 0201; Manufacturer: Murata Electronics; Manufacturer Part Number: GRM0335C1H3R9CA01D; Package Size: 0201; JLCPCB Basic Part: No; JLCPCB Part Number: C76926; Supplier 1: LCSC; Category: Capacitors - MLCC; Supplier Part Number 1: C76926; Voltage Rating: 50V; Temperature Coefficient: C0G; RoHS: Yes; ComponentLink1Description: Datasheet; ComponentLink1URL: https://wmsc.lcsc.com/wmsc/upload/file/pdf/v2/lcsc/1811081513_Murata-Electronics-GRM0335C1H3R9CA01D_C76926.pdf; ComponentLink2Description: JLCPCB Part URL; ComponentLink2URL: https://jlcpcb.com/partdetail/C76926; ComponentLink3Description: LCSC Part URL; ComponentLink3URL: https://lcsc.com/product-detail/Multilayer-Ceramic-Capacitors-MLCC---SMD-SMT_Murata-Electronics-Murata-Electronics-GRM0335C1H3R9CA01D_C76926.html
footprint CAP-0201 (0201 (0603M) Capacitor)
pins: 1, 2

## GRM0335C1H4R3BA01D
designator C?  Capacitance: 4.3pF  (hidden comment: *)
Capacitor, Ceramic (MLCC), 4.3pF, 50V, C0G, SMD 0201; Manufacturer: Murata Electronics; Manufacturer Part Number: GRM0335C1H4R3BA01D; Package Size: 0201; JLCPCB Basic Part: No; JLCPCB Part Number: C337490; Supplier 1: LCSC; Category: Capacitors - MLCC; Supplier Part Number 1: C337490; Voltage Rating: 50V; Temperature Coefficient: C0G; RoHS: Yes; ComponentLink1Description: Datasheet; ComponentLink1URL: https://wmsc.lcsc.com/wmsc/upload/file/pdf/v2/lcsc/2304140030_Murata-Electronics-GRM0335C1H4R3BA01D_C337490.pdf; ComponentLink2Description: JLCPCB Part URL; ComponentLink2URL: https://jlcpcb.com/partdetail/C337490; ComponentLink3Description: LCSC Part URL; ComponentLink3URL: https://lcsc.com/product-detail/Multilayer-Ceramic-Capacitors-MLCC---SMD-SMT_Murata-Electronics-Murata-Electronics-GRM0335C1H4R3BA01D_C337490.html
footprint CAP-0201 (0201 (0603M) Capacitor)
pins: 1, 2

## GRM0335C1H4R7BA01D
designator C?  Capacitance: 4.7pF  (hidden comment: *)
Capacitor, Ceramic (MLCC), 4.7pF, 50V, C0G, SMD 0201; Manufacturer: Murata Electronics; Manufacturer Part Number: GRM0335C1H4R7BA01D; Package Size: 0201; JLCPCB Basic Part: No; JLCPCB Part Number: C161428; Supplier 1: LCSC; Category: Capacitors - MLCC; Supplier Part Number 1: C161428; Voltage Rating: 50V; Temperature Coefficient: C0G; RoHS: Yes; ComponentLink1Description: Datasheet; ComponentLink1URL: https://wmsc.lcsc.com/wmsc/upload/file/pdf/v2/lcsc/1811081511_Murata-Electronics-GRM0335C1H4R7BA01D_C161428.pdf; ComponentLink2Description: JLCPCB Part URL; ComponentLink2URL: https://jlcpcb.com/partdetail/C161428; ComponentLink3Description: LCSC Part URL; ComponentLink3URL: https://lcsc.com/product-detail/Multilayer-Ceramic-Capacitors-MLCC---SMD-SMT_Murata-Electronics-Murata-Electronics-GRM0335C1H4R7BA01D_C161428.html
footprint CAP-0201 (0201 (0603M) Capacitor)
pins: 1, 2

## GRM0335C1H4R7CA01D
designator C?  Capacitance: 4.7pF  (hidden comment: *)
Capacitor, Ceramic (MLCC), 4.7pF, 50V, C0G, SMD 0201; Manufacturer: Murata Electronics; Manufacturer Part Number: GRM0335C1H4R7CA01D; Package Size: 0201; JLCPCB Basic Part: No; JLCPCB Part Number: C85911; Supplier 1: LCSC; Category: Capacitors - MLCC; Supplier Part Number 1: C85911; Voltage Rating: 50V; Temperature Coefficient: C0G; RoHS: Yes; ComponentLink1Description: Datasheet; ComponentLink1URL: https://wmsc.lcsc.com/wmsc/upload/file/pdf/v2/lcsc/2304140030_Murata-Electronics-GRM0335C1H4R7CA01D_C85911.pdf; ComponentLink2Description: JLCPCB Part URL; ComponentLink2URL: https://jlcpcb.com/partdetail/C85911; ComponentLink3Description: LCSC Part URL; ComponentLink3URL: https://lcsc.com/product-detail/Multilayer-Ceramic-Capacitors-MLCC---SMD-SMT_Murata-Electronics-Murata-Electronics-GRM0335C1H4R7CA01D_C85911.html
footprint CAP-0201 (0201 (0603M) Capacitor)
pins: 1, 2

## GRM0335C1H5R0CA01D
designator C?  Capacitance: 5pF  (hidden comment: *)
Capacitor, Ceramic (MLCC), 5pF, 50V, C0G, SMD 0201; Manufacturer: Murata Electronics; Manufacturer Part Number: GRM0335C1H5R0CA01D; Package Size: 0201; JLCPCB Basic Part: No; JLCPCB Part Number: C85913; Supplier 1: LCSC; Category: Capacitors - MLCC; Supplier Part Number 1: C85913; Voltage Rating: 50V; Temperature Coefficient: C0G; RoHS: Yes; ComponentLink1Description: Datasheet; ComponentLink1URL: https://wmsc.lcsc.com/wmsc/upload/file/pdf/v2/lcsc/2304140030_Murata-Electronics-GRM0335C1H5R0CA01D_C85913.pdf; ComponentLink2Description: JLCPCB Part URL; ComponentLink2URL: https://jlcpcb.com/partdetail/C85913; ComponentLink3Description: LCSC Part URL; ComponentLink3URL: https://lcsc.com/product-detail/Multilayer-Ceramic-Capacitors-MLCC---SMD-SMT_Murata-Electronics-Murata-Electronics-GRM0335C1H5R0CA01D_C85913.html
footprint CAP-0201 (0201 (0603M) Capacitor)
pins: 1, 2

## GRM0335C1H5R1BA01D
designator C?  Capacitance: 5.1pF  (hidden comment: *)
Capacitor, Ceramic (MLCC), 5.1pF, 50V, C0G, SMD 0201; Manufacturer: Murata Electronics; Manufacturer Part Number: GRM0335C1H5R1BA01D; Package Size: 0201; JLCPCB Basic Part: No; JLCPCB Part Number: C441749; Supplier 1: LCSC; Category: Capacitors - MLCC; Supplier Part Number 1: C441749; Voltage Rating: 50V; Temperature Coefficient: C0G; RoHS: Yes; ComponentLink1Description: Datasheet; ComponentLink1URL: https://wmsc.lcsc.com/wmsc/upload/file/pdf/v2/lcsc/2304140030_Murata-Electronics-GRM0335C1H5R1BA01D_C441749.pdf; ComponentLink2Description: JLCPCB Part URL; ComponentLink2URL: https://jlcpcb.com/partdetail/C441749; ComponentLink3Description: LCSC Part URL; ComponentLink3URL: https://lcsc.com/product-detail/Multilayer-Ceramic-Capacitors-MLCC---SMD-SMT_Murata-Electronics-Murata-Electronics-GRM0335C1H5R1BA01D_C441749.html
footprint CAP-0201 (0201 (0603M) Capacitor)
pins: 1, 2

## GRM0335C1H5R2BA01D
designator C?  Capacitance: 5.2pF  (hidden comment: *)
Capacitor, Ceramic (MLCC), 5.2pF, 50V, null, SMD 0201; Manufacturer: Murata Electronics; Manufacturer Part Number: GRM0335C1H5R2BA01D; Package Size: 0201; JLCPCB Basic Part: No; JLCPCB Part Number: C2183855; Supplier 1: LCSC; Category: Capacitors - MLCC; Supplier Part Number 1: C2183855; Voltage Rating: 50V; Temperature Coefficient: null; RoHS: Yes; ComponentLink1Description: Datasheet; ComponentLink1URL: https://wmsc.lcsc.com/wmsc/upload/file/pdf/v2/lcsc/2202041400_Murata-Electronics-GRM0335C1H5R2BA01D_C2183855.pdf; ComponentLink2Description: JLCPCB Part URL; ComponentLink2URL: https://jlcpcb.com/partdetail/C2183855; ComponentLink3Description: LCSC Part URL; ComponentLink3URL: https://lcsc.com/product-detail/Multilayer-Ceramic-Capacitors-MLCC---SMD-SMT_Murata-Electronics-Murata-Electronics-GRM0335C1H5R2BA01D_C2183855.html
footprint CAP-0201 (0201 (0603M) Capacitor)
pins: 1, 2

## GRM0335C1H5R4BA01D
designator C?  Capacitance: 5.4pF  (hidden comment: *)
Capacitor, Ceramic (MLCC), 5.4pF, 50V, null, SMD 0201; Manufacturer: Murata Electronics; Manufacturer Part Number: GRM0335C1H5R4BA01D; Package Size: 0201; JLCPCB Basic Part: No; JLCPCB Part Number: C2183857; Supplier 1: LCSC; Category: Capacitors - MLCC; Supplier Part Number 1: C2183857; Voltage Rating: 50V; Temperature Coefficient: null; RoHS: Yes; ComponentLink1Description: Datasheet; ComponentLink1URL: https://wmsc.lcsc.com/wmsc/upload/file/pdf/v2/lcsc/2202041400_Murata-Electronics-GRM0335C1H5R4BA01D_C2183857.pdf; ComponentLink2Description: JLCPCB Part URL; ComponentLink2URL: https://jlcpcb.com/partdetail/C2183857; ComponentLink3Description: LCSC Part URL; ComponentLink3URL: https://lcsc.com/product-detail/Multilayer-Ceramic-Capacitors-MLCC---SMD-SMT_Murata-Electronics-Murata-Electronics-GRM0335C1H5R4BA01D_C2183857.html
footprint CAP-0201 (0201 (0603M) Capacitor)
pins: 1, 2

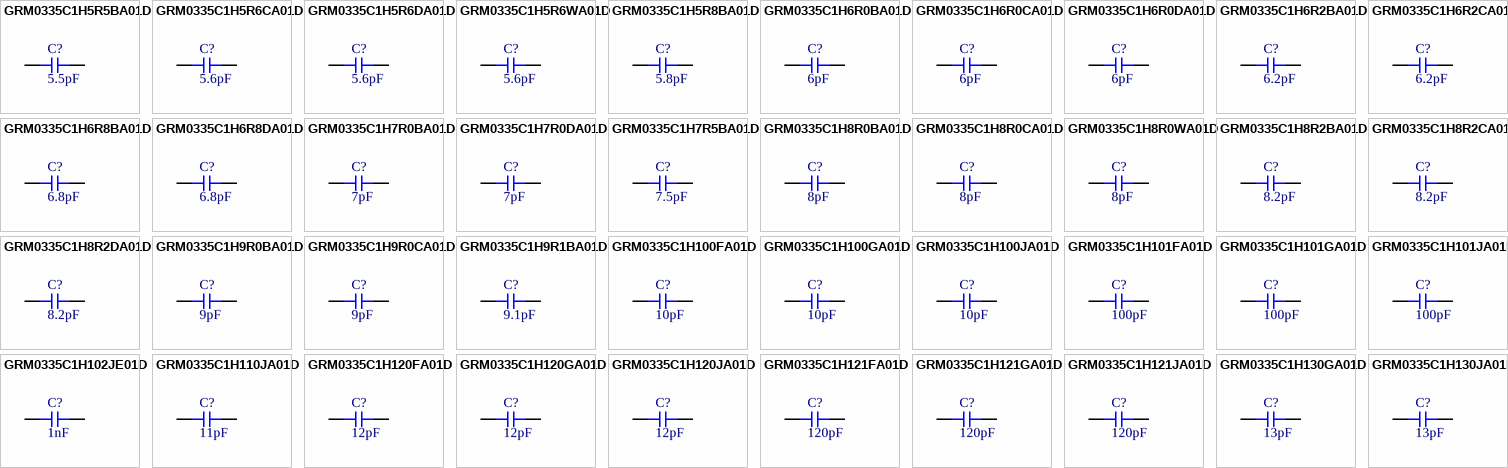
[diagram p23: symbols GRM0335C1H5R5BA01D to GRM0335C1H130JA01D]

## GRM0335C1H5R5BA01D
designator C?  Capacitance: 5.5pF  (hidden comment: *)
Capacitor, Ceramic (MLCC), 5.5pF, 50V, C0G, SMD 0201; Manufacturer: Murata Electronics; Manufacturer Part Number: GRM0335C1H5R5BA01D; Package Size: 0201; JLCPCB Basic Part: No; JLCPCB Part Number: C3845773; Supplier 1: LCSC; Category: Capacitors - MLCC; Supplier Part Number 1: C3845773; Voltage Rating: 50V; Temperature Coefficient: C0G; RoHS: Yes; ComponentLink1Description: Datasheet; ComponentLink1URL: https://wmsc.lcsc.com/wmsc/upload/file/pdf/v2/lcsc/2308111500_Murata-Electronics-GRM0335C1H5R5BA01D_C3845773.pdf; ComponentLink2Description: JLCPCB Part URL; ComponentLink2URL: https://jlcpcb.com/partdetail/C3845773; ComponentLink3Description: LCSC Part URL; ComponentLink3URL: https://lcsc.com/product-detail/Multilayer-Ceramic-Capacitors-MLCC---SMD-SMT_Murata-Electronics-Murata-Electronics-GRM0335C1H5R5BA01D_C3845773.html
footprint CAP-0201 (0201 (0603M) Capacitor)
pins: 1, 2